# Altium schematic symbol library CUSTOM SCH - Copy.SchLib: 494 symbols (part 1 of 6)
Pins are listed as number, name and electrical type; pins without a type are passive.

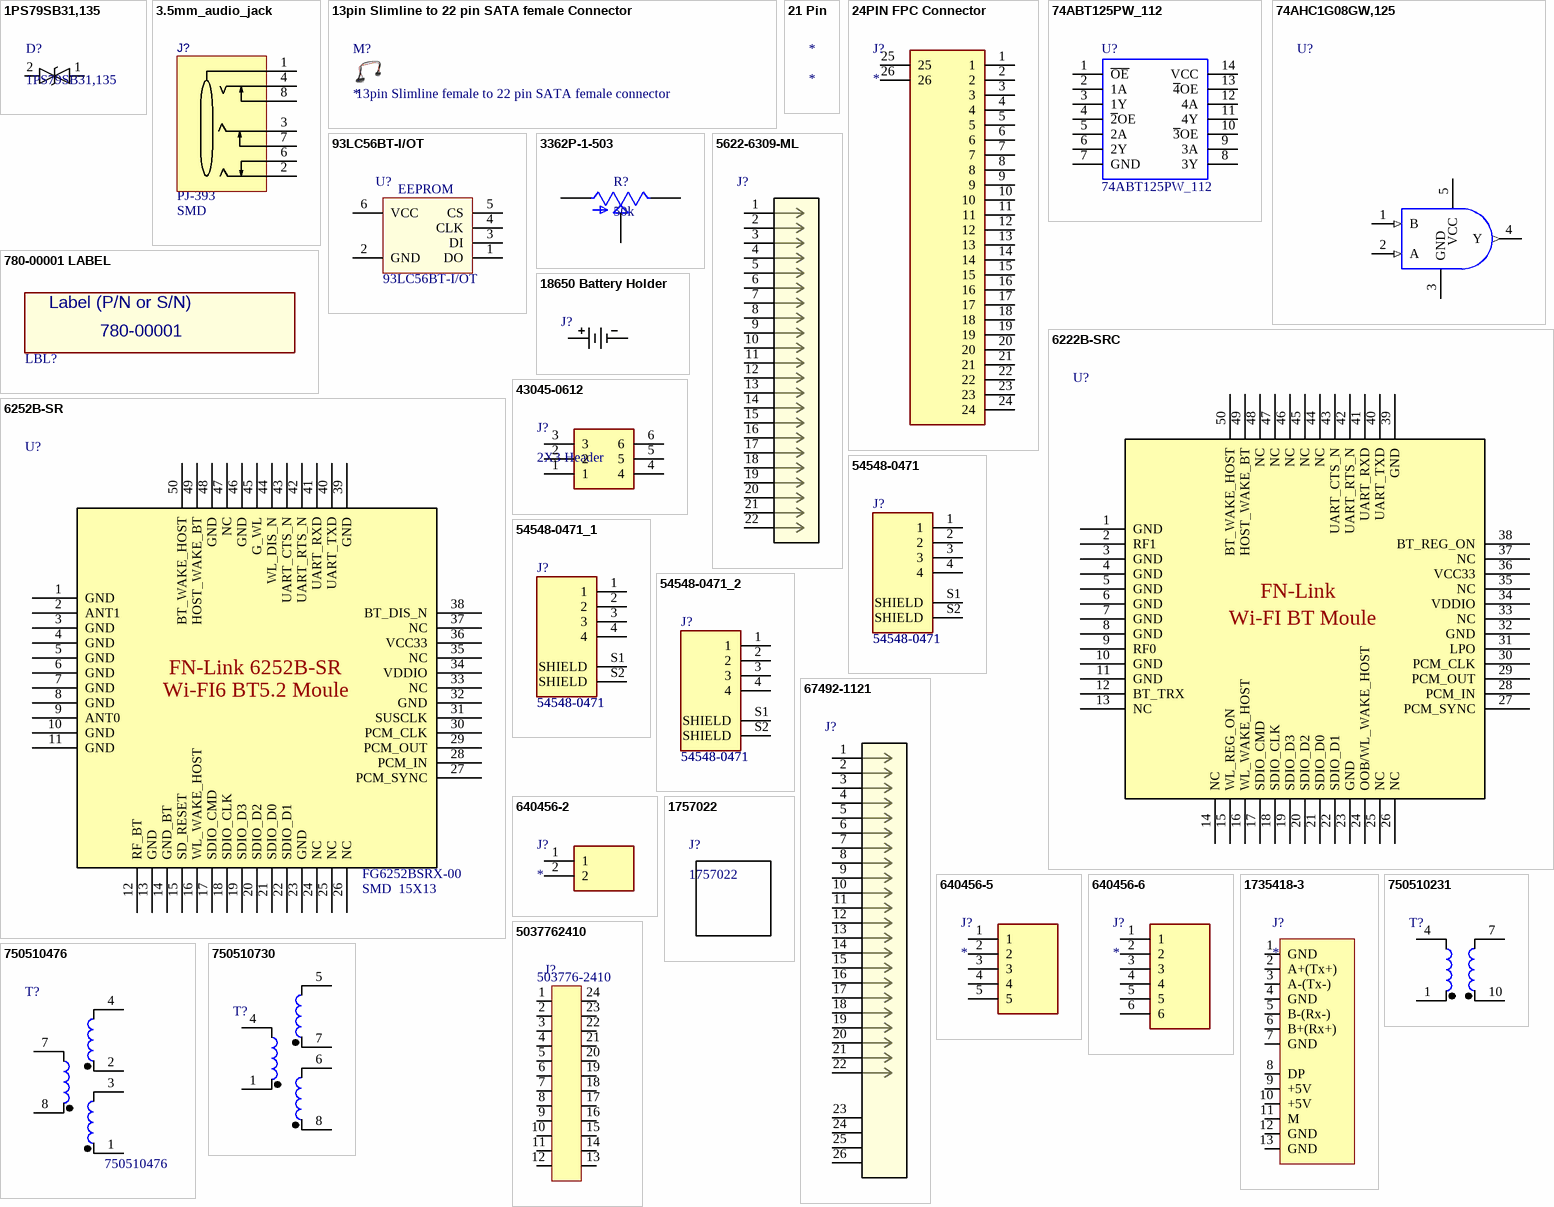
[diagram p0: symbols 1PS79SB31,135 to 5037762410]

## 1PS79SB31,135
designator D?
Diode Schottky 30V 0.2A 2-Pin SOD-523 T/R; MF: Nexperia; MP: 1PS79SB31,135; SnapEDA_Link: https://www.snapeda.com/parts/1PS79SB31%2C135/Nexperia%20USA%20Inc./view-part/?ref=snap; Package: SOD-523 NXP Semiconductors; Digi-Key_Part_Number: 1PS79SB31,135-ND; Digi-Key_Purchase_URL: https://www.digikey.in/product-detail/en/nexperia-usa-inc/1PS79SB31,135/1PS79SB31,135-ND/1229079?utm_source=snapeda&utm_medium=aggregator&utm_campaign=symbol; Value: *
footprint SOD523
pins: 1 K, 2 A

## 3.5mm_audio_jack
designator J?  Manufacturer Part Number: PJ-393  Case/Package: SMD
3.5mm headphone jack SMD Audio Connectors ROHS
footprint PJ-393
pins: 1, 2, 3, 4, 6, 7, 8

## 13pin Slimline to 22 pin SATA female Connector
designator M?  (mechanical)
13pin slimline female to 22 pin SATA female connector; Manufacturer Part Number: 13pin Slimline female to 22 pin SATA female connector

## 21 Pin
designator *

## 24PIN FPC Connector
designator J?
0.5mm Pitch 24 Way Straight SMT FPC Connector; Manufacturer Part Number: 68712414522; Case/Package: SMD/SMT
footprint 68712414522
footprint 24PIN 0.5MM FPC CONNECTOR
pins: 1, 2, 3, 4, 5, 6, 7, 8, 9, 10, 11, 12, 13, 14, 15, 16, 17, 18, 19, 20, 21, 22, 23, 24, 25, 26

## 74ABT125PW_112
designator U?
Buffers & Line Drivers QUAD BUFFER 3-S; Manufacturer_Name: Nexperia; Manufacturer_Part_Number: 74ABT125PW,112; Geometry.Height: 1.1mm; RS Part Number: *; RS Price/Stock: *; Mouser Part Number: 771-ABT125PW112; Mouser Price/Stock: https://www.mouser.com/Search/Refine.aspx?Keyword=771-ABT125PW112; Datasheet Link: https://assets.nexperia.com/documents/data-sheet/74ABT125.pdf
footprint 74ABT125PW
pins: 1 ~{OE}, 2 1A, 3 1Y, 4 ~{2}OE, 5 2A, 6 2Y, 7 GND, 8 3Y, 9 3A, 10 ~{3}OE, 11 4Y, 12 4A, 13 ~{4}OE, 14 VCC

## 74AHC1G08GW,125
designator U?  (value not drawn)
Logic IC - Gate NXP Semiconductors 74AHC1G08GW, 125 AND gate 74AHC TSSOP 5; Manufacturer: Nexperia; Supplier 1: Digi-Key; Manufacturer Part Number: 74AHC1G08GW,125; Stock 1: 41783; Pricing 1: 1=0.27, 10=0.223, 25=0.1872, 100=0.1184, 250=0.0914, 500=0.0779, 1000=0.053 (USD); Case/Package: SOT-353; Supplier Part Number 1: 1727-3148-1-ND
footprint SOT353
pins: 1 B (in), 2 A (in), 3 GND, 4 Y (out), 5 VCC (power)

## 93LC56BT-I/OT
designator U?  Memory Type: EEPROM  (hidden comment: 93LC56BT-I/OT)
MICROCHIP - 93LC56BT-I/OT. - 2K, 128 X 16, SERIAL EE, IND ROHS COMPLIANT: YES; Density: 2Kb; Max Supply Voltage: 5.5V; Min Supply Voltage: 2.5V; Access Time: 250ns; Frequency: 2MHz; Nominal Supply Current: 2mA; Supplier 1: Digi-Key; Manufacturer: Microchip; RoHS: Yes; Category: EEPROM; Stock 1: 10933; Pricing 1: 1=0.23000, 25=0.22040, 100=0.21000 (USD); Mount: Surface Mount; Case/Package: SOT-23-6; Number of Pins: 6; Contact Plating: Tin,Matte; Min Operating Temperature: -40°C; Max Operating Temperature: 85°C; Packaging: Tape and Reel; Package Quantity: 3000; Interface: Serial; Memory Size: 2Kb; Max Frequency: 2MHz; Length: 3.1mm; Height: 1.3mm; Width: 1.8mm; Radiation Hardening: No; REACH SVHC: No SVHC; Lead Free: Lead Free; ComponentLink1URL: https://datasheet.ciiva.com/48496/jp013939-48496476.pdf?src-supplier=Avnet; ComponentLink1Description: https://datasheet.ciiva.com/48496/jp013939-48496476.pdf?src-supplier=Avnet; ComponentLink2URL: https://datasheet.ciiva.com/16216/filehandler-aspxddocname-en013939-16216574.pdf?src-supplier=Future+Electronics; ComponentLink2Description: https://datasheet.ciiva.com/16216/filehandler-aspxddocname-en013939-16216574.pdf?src-supplier=Future+Electronics; ComponentLink3URL: https://datasheet.ciiva.com/3185/jp013939-3185519.pdf?src-supplier=Avnet; ComponentLink3Description: https://datasheet.ciiva.com/3185/jp013939-3185519.pdf?src-supplier=Avnet; ComponentLink4URL: https://datasheet.ciiva.com/16622/jp013939-16622127.pdf?src-supplier=Avnet+Europe; ComponentLink4Description: https://datasheet.ciiva.com/16622/jp013939-16622127.pdf?src-supplier=Avnet+Europe; Supplier Part Number 1: 93LC56BT-I/OTCT-ND; Manufacturer Part Number: 93LC56BT-I/OT
footprint SOT-23-6
pins: 1 DO, 2 GND, 3 DI, 4 CLK, 5 CS, 6 VCC

## 780-00001 LABEL
designator LBL?, comment Label (P/N or S/N)  PartNumber: 780-00001
Label, blank, 1.25" x .25", High Temp Rated; Device: 780-00001

## 3362P-1-503
designator R?, comment 50k
50 kOhms 0.5W, 1/2W PC Pins Through Hole Trimmer Potentiometer Cermet 1 Turn Top Finger Adjustment; Manufacturer Part Number: 3362P-1-503; Case/Package: 3116 Bourns; Value: 50k
footprint TRIM_3362P-1-503
footprint TRIM_3362P-1-503
pins: 1 CCW, 2 WIPER, 3 CW

## 5622-6309-ML
designator J?
SATA CONNECTOR, PLUG, 22 POSITION, Connector Type:SATA; Gender:Male; Manufacturer 1: 3M; Manufacturer Part Number 1: 5622-6309-ML; Gender: Male; Max Current Rating: 1.5A; Number of Positions: 22; Insulation Resistance: 1GR; Number of Ports: 1; Connector Type: Plug,SATA; Pitch: 1.27mm; ComponentLink1URL: https://datasheet.ciiva.com/16651/0674921121-pcb-receptacles-16651858.pdf?src-supplier=Avnet+Europe; ComponentLink1Description: https://datasheet.ciiva.com/16651/0674921121-pcb-receptacles-16651858.pdf?src-supplier=Avnet+Europe; Supplier 1: Digi-Key; RoHS: Yes; Category: Connectors; Stock 1: 5747; Pricing 1: 1=2.88000, 10=2.76500, 25=2.53440, 50=2.41920, 100=2.30400, 250=2.01600, 500=1.95840, 1000=1.67040, 2500=1.55520 (USD); Mount: Straddle Mount,Edge; Housing Material: Thermoplastic; Contact Plating: Gold; Contact Material: Copper Alloy; Color: Black; Number of Terminals: 22; Housing Color: Black; Min Operating Temperature: -40°C; Max Operating Temperature: 85°C; Packaging: Tray; Termination: Solder; Orientation: Straight; Package Quantity: 1944; Current Rating: 1.5A; Number of Rows: 1; Number of Contacts: 22; Length: 45.77mm; Depth: 12mm; Flammability Rating: UL94 V-0; REACH SVHC: No SVHC; Lead Free: Lead Free; ComponentLink2URL: https://datasheet.ciiva.com/25617/0900766b80934e8c-25617710.pdf?src-supplier=RSComponents; ComponentLink2Description: https://datasheet.ciiva.com/25617/0900766b80934e8c-25617710.pdf?src-supplier=RSComponents; ComponentLink3URL: https://datasheet.ciiva.com/689/cd2109-689552.pdf?src-supplier=Digi-Key; ComponentLink3Description: https://datasheet.ciiva.com/689/cd2109-689552.pdf?src-supplier=Digi-Key; ComponentLink4URL: https://datasheet.ciiva.com/3955/mediawebserver3-3955586.pdf?src-supplier=Arrow; ComponentLink4Description: https://datasheet.ciiva.com/3955/mediawebserver3-3955586.pdf?src-supplier=Arrow; ComponentLink5URL: https://datasheet.ciiva.com/4570/cd2109-4570023.pdf?src-supplier=Mouser; ComponentLink5Description: https://datasheet.ciiva.com/4570/cd2109-4570023.pdf?src-supplier=Mouser; ComponentLink6URL: https://datasheet.ciiva.com/8015/cd2109-8015174.pdf?src-supplier=Element14; ComponentLink6Description: https://datasheet.ciiva.com/8015/cd2109-8015174.pdf?src-supplier=Element14; Supplier Part Number 1: 3M5555-ND
footprint 5622-6309-ML
pins: 1, 2, 3, 4, 5, 6, 7, 8, 9, 10, 11, 12, 13, 14, 15, 16, 17, 18, 19, 20, 21, 22

## 6222B-SRC
designator U?
5GHz SDIO WiFi BT Module With RTL8822CS Chipset Support 802.11ac; Manufacturer Part Number: FG6222BSRC-00; Case/Package: SMD  15X13
footprint FG6222BSRC-00
pins: 1 GND, 2 RF1, 3 GND, 4 GND, 5 GND, 6 GND, 7 GND, 8 GND, 9 RF0, 10 GND, 11 GND, 12 BT_TRX, 13 NC, 14 NC, 15 WL_REG_ON, 16 WL_WAKE_HOST, 17 SDIO_CMD, 18 SDIO_CLK, 19 SDIO_D3, 20 SDIO_D2, 21 SDIO_D0, 22 SDIO_D1, 23 GND, 24 OOB/WL_WAKE_HOST, 25 NC, 26 NC, 27 PCM_SYNC, 28 PCM_IN, 29 PCM_OUT, 30 PCM_CLK, 31 LPO, 32 GND, 33 NC, 34 VDDIO, 35 NC, 36 VCC33, 37 NC, 38 BT_REG_ON, 39 GND, 40 UART_TXD, 41 UART_RXD, 42 UART_RTS_N, 43 UART_CTS_N, 44 NC, 45 NC, 46 NC, 47 NC, 48 NC, 49 HOST_WAKE_BT, 50 BT_WAKE_HOST
text: FN-Link; Wi-FI BT Moule

## 6252B-SR
designator U?  Manufacturer Part Number: FG6252BSRX-00  Case/Package: SMD  15X13
WiFi6 SDIO WiFi BT5.2 Module With
footprint FG6252BSRX-00
pins: 1 GND, 2 ANT1, 3 GND, 4 GND, 5 GND, 6 GND, 7 GND, 8 GND, 9 ANT0, 10 GND, 11 GND, 12 RF_BT, 13 GND, 14 GND_BT, 15 SD_RESET, 16 WL_WAKE_HOST, 17 SDIO_CMD, 18 SDIO_CLK, 19 SDIO_D3, 20 SDIO_D2, 21 SDIO_D0, 22 SDIO_D1, 23 GND, 24 NC, 25 NC, 26 NC, 27 PCM_SYNC, 28 PCM_IN, 29 PCM_OUT, 30 PCM_CLK, 31 SUSCLK, 32 GND, 33 NC, 34 VDDIO, 35 NC, 36 VCC33, 37 NC, 38 BT_DIS_N, 39 GND, 40 UART_TXD, 41 UART_RXD, 42 UART_RTS_N, 43 UART_CTS_N, 44 WL_DIS_N, 45 G_WL, 46 GND, 47 NC, 48 GND, 49 HOST_WAKE_BT, 50 BT_WAKE_HOST
text: FN-Link 6252B-SR; Wi-FI6 BT5.2 Moule

## 18650 Battery Holder
designator J?, comment 1042P  (value not drawn)
Manufacturer_Part_Number: 1042P; Case/Package: SMT
footprint 1042P_KEY
footprint 18650 Battery holder (1042P)
pins: 1, 2

## 43045-0612
designator J?, comment 2X3 Header
Micro-Fit 3.0 Vertical Header; Manufacturer Part Number: 43045-0612; Case/Package: TH
footprint 430450612
pins: 1, 2, 3, 4, 5, 6

## 54548-0471
designator J?
FFC & FPC Connectors 0.5 FPC 4 pin; Manufacturer Part Number: 54548-0471
footprint MOLEX_54548-0471
pins: 1, 2, 3, 4, S1 SHIELD, S2 SHIELD

## 54548-0471_1
designator J?, comment 54548-0471
FFC & FPC Connectors 0.5 FPC 4 pin; Manufacturer Part Number: 54548-0471
footprint MOLEX_54548-0471
pins: 1, 2, 3, 4, S1 SHIELD, S2 SHIELD

## 54548-0471_2
designator J?, comment 54548-0471
FFC & FPC Connectors 0.5 FPC 4 pin; Manufacturer Part Number: 54548-0471
footprint MOLEX_54548-0471
pins: 1, 2, 3, 4, S1 SHIELD, S2 SHIELD

## 67492-1121
designator J?
Conn SATA RCP 15Power/7Signal POS 1.27mm Solder RA SMD 22 Terminal 1 Port Tray; Manufacturer 1: Molex; Manufacturer Part Number 1: 67492-1121; Connector Type: SMD/SMT; Number of Positions: 22; Max Voltage Rating (DC): 15V; Current Rating: 1.5A; Gender: Female; Glow Wire Compliant: Non-compliant; Supplier 1: Mouser; RoHS: Yes; Category: Headers and Wire Housings; Stock 1: 83; Pricing 1: 1=3.18000, 10=3.05000, 25=2.67000, 100=2.54000, 250=2.22000, 500=2.16000, 1000=1.84000, 2500=1.71000, 5000=1.65000 (USD); Mount: Surface Mount; Case/Package: SMD/SMT; Housing Material: Thermoplastic; Contact Plating: Gold; Contact Material: Copper Alloy; Color: Black; Min Operating Temperature: -35°C; Max Operating Temperature: 85°C; Termination: Solder; Orientation: Right Angle; Package Quantity: 840; Packaging: Tray; Number of Rows: 1; Number of Circuits: 22; Voltage Rating (DC): 15V; Pitch: 1.27mm; Radiation Hardening: No; ComponentLink1URL: https://datasheet.ciiva.com/16651/0674921121-pcb-receptacles-16651858.pdf?src-supplier=Avnet+Europe; ComponentLink1Description: https://datasheet.ciiva.com/16651/0674921121-pcb-receptacles-16651858.pdf?src-supplier=Avnet+Europe; Supplier Part Number 1: 538-67492-1121
footprint 67492-1121
pins: 1, 2, 3, 4, 5, 6, 7, 8, 9, 10, 11, 12, 13, 14, 15, 16, 17, 18, 19, 20, 21, 22, 23, 24, 25, 26

## 640456-2
designator J?
2 way MTA straight friction lock header TE Connectivity MTA-100 Series; Manufacturer Part Number: 640456-2; Datasheet Link: http://www.te.com/commerce/DocumentDelivery/DDEController?Action=showdoc&DocId=Customer+Drawing%7F640456%7FW3%7Fpdf%7FEnglish%7FENG_CD_640456_W3.pdf%7F640456-2; Height: 10.414mm; Manufacturer_Name: TE Connectivity
footprint SHDR2W66P0X254_1X2_508X572X1041P
footprint SHDR2W66P0X254_1X2_508X572X1041P
pins: 1, 2

## 640456-5
designator J?
5 way MTA straight friction lock header; Manufacturer_Part_Number: 640456-5; Package: TH; Value: *
footprint SHDR5W66P0X254_1X5_1270X572X1024P
footprint SHDR5W66P0X254_1X5_1270X572X1024P
pins: 1, 2, 3, 4, 5

## 640456-6
designator J?
Headers & Wire Housings FRICTION LCK HDR 6P Straight Post tin; Manufacturer_Name: TE Connectivity; Manufacturer Part Number: 640456-6; Datasheet Link: https://www.mouser.com/ProductDetail/TE-Connectivity/640456-6?qs=%2F35zJ5USjomb%252bGgX%252bBnrrQ%3D%3D&gclid=CjwKCAjwkoz7BRBPEiwAeKw3q0mcLif-2aBBbbX-TwuIeMidB_ARULgbAE-SJPQzeNro84r-4lxoHhoCr1IQAvD_BwE; Height: 10.033mm; Package: Through Hole
footprint SHDR6W66P0X254_1X6_1524X572X1003P
pins: 1, 2, 3, 4, 5, 6

## 1735418-3
designator J?
CONN SATA PLUG 13POS SLD R/A SMD; Manufacturer Part Number: 1735418-3; Case/Package: SMD
footprint 1735418-3
pins: 1 GND, 2 A+(Tx+), 3 A-(Tx-), 4 GND, 5 B-(Rx-), 6 B+(Rx+), 7 GND, 8 DP, 9 +5V, 10 +5V, 11 M, 12 GND, 13 GND

## 1757022
designator J?  (mechanical)
TERM BLOCK PLUG 3POS STR 5.08MM; Manufacturer Part Number: 1757022

## 750510231
designator T?  (value not drawn)
Manufacturer: Wurth Electronics; Manufacturer Part Number: 750510231; Supplier 1: Mouser; Stock 1: 346; Pricing 1: 1=3.43, 10=3.21, 50=2.89, 100=2.66, 250=2.39, 500=2.15, 1000=2.15, 10000=2.15 (USD); Packaging: Tray; Package Quantity: 650; ComponentLink1URL: http://www.mouser.com/ds/2/445/750510231-465484.pdf?src-supplier=Mouser; ComponentLink1Description: http://www.mouser.com/ds/2/445/750510231-465484.pdf?src-supplier=Mouser; Supplier Part Number 1: 710-750510231
footprint L14_W14_H13.46
pins: 1 5, 4, 7 5, 10 6

## 750510476
designator T?  Manufacturer Part Number: 750510476  (hidden comment: *)
Manufacturer: Wurth Electronics; Shielding: Unshielded; Inductance: 870uH; DC Resistance (DCR): 85mR; Supplier 1: Digi-Key; Stock 1: 881; Pricing 1: 1=5.86, 10=5.782, 50=5.421, 100=4.879, 500=4.337 (USD); Mount: Through Hole; Min Operating Temperature: -40°C; Max Operating Temperature: 125°C; Packaging: Tray; Termination: Pin; Length: 19.8mm; Height: 10.16mm; Width: 19.69mm; Height - Seated (Max): 10.16mm; ComponentLink1URL: http://www.mouser.com/ds/2/445/750510476-265876.pdf?src-supplier=Mouser; ComponentLink1Description: http://www.mouser.com/ds/2/445/750510476-265876.pdf?src-supplier=Mouser; ComponentLink2URL: http://katalog.we-online.de/pbs/datasheet/750510476.pdf?src-supplier=Digi-Key; ComponentLink2Description: http://katalog.we-online.de/pbs/datasheet/750510476.pdf?src-supplier=Digi-Key; Supplier Part Number 1: 1297-1074-ND
footprint L13.72_W19.8_H10.16
pins: 1, 2, 3, 4, 7, 8

## 750510730
designator T?  (value not drawn)
Manufacturer: Wurth Electronics Midcom; Manufacturer Part Number: 750510730; Inductance: 1uH; Turns Ratio: 1:1; Supplier 1: Digi-Key; Stock 1: 0; Pricing 1: 140=3.696, 280=3.36 (USD); Mount: Surface Mount; Packaging: Tape and Reel; ComponentLink1URL: https://katalog.we-online.de/ctm/datasheet/750510730.pdf?src-supplier=Digi-Key; ComponentLink1Description: https://katalog.we-online.de/ctm/datasheet/750510730.pdf?src-supplier=Digi-Key; Supplier Part Number 1: 1297-1203-2-ND
footprint L13.97_W15.4_H13.2
pins: 1 5, 4, 5, 6, 7, 8 6

## 5037762410
designator J?  Manufacturer Part Number: 503776-2410  (hidden comment: 5037762410)
CONN PLUG 24CKT DUAL SMD; Manufacturer 1: Molex; Gender: Male; Number of Circuits: 24; Voltage Rating (AC): 50V; Current Rating: 300mA; Mated Stacking Heights: 0.8mm; Pitch: 0.4mm; Glow Wire Compliant: Non-compliant; Supplier 1: Digi-Key; RoHS: Yes; Category: Headers and Wire Housings; Stock 1: 1034; Pricing 1: 1=1.17000, 10=0.97100, 100=0.80920, 1000=0.64736 (USD); Mount: Surface Mount; Material: Copper Alloy; Housing Material: Polymer; Contact Material: Copper Alloy; Contact Plating: Gold; Min Operating Temperature: -40°C; Max Operating Temperature: 85°C; Orientation: Vertical; Number of Rows: 2; Connector Type: Plug; Number of Positions: 24; Packaging: Tape and Reel; Termination: SMD/SMT; Package Quantity: 3000; Halogen Free: Low Halogen; ELV: Compliant; REACH SVHC: No SVHC; ComponentLink1URL: https://datasheet.ciiva.com/13869/5037762410-pcb-headers-263019-13869703.pdf?src-supplier=Mouser; ComponentLink1Description: https://datasheet.ciiva.com/13869/5037762410-pcb-headers-263019-13869703.pdf?src-supplier=Mouser; ComponentLink2URL: https://datasheet.ciiva.com/394/5037762410-sd-394935.pdf?src-supplier=Digi-Key; ComponentLink2Description: https://datasheet.ciiva.com/394/5037762410-sd-394935.pdf?src-supplier=Digi-Key; ComponentLink3URL: https://datasheet.ciiva.com/394/5037762410-sd-394936.pdf?src-supplier=Digi-Key; ComponentLink3Description: https://datasheet.ciiva.com/394/5037762410-sd-394936.pdf?src-supplier=Digi-Key; ComponentLink4URL: https://datasheet.ciiva.com/394/5037762410-sd-394937.pdf?src-supplier=Digi-Key; ComponentLink4Description: https://datasheet.ciiva.com/394/5037762410-sd-394937.pdf?src-supplier=Digi-Key; Supplier Part Number 1: WM6257CT-ND
footprint 5037762410
pins: 1, 2, 3, 4, 5, 6, 7, 8, 9, 10, 11, 12, 13, 14, 15, 16, 17, 18, 19, 20, 21, 22, 23, 24

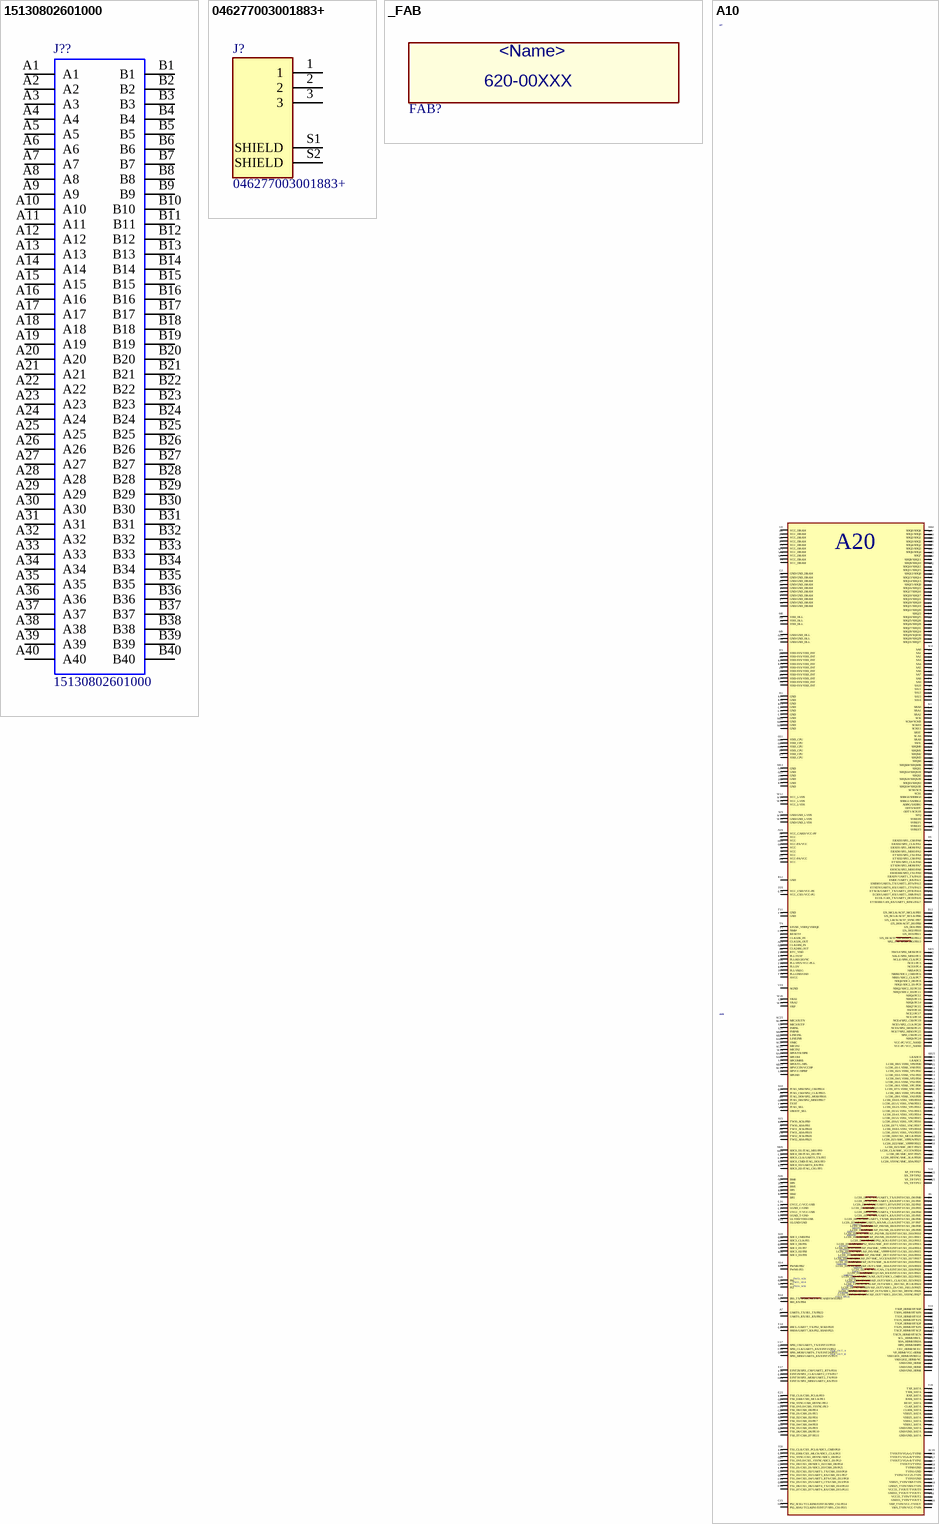
[diagram p1: symbols 15130802601000 to A10]

## 15130802601000
designator J??
Connectors, Male connector, Reflow soldering termination (SMT), Contacts: 80, Straight; Manufacturer_Name: HARTING; Mouser Part Number: 617-15130802601000; Mouser Price/Stock: https://www.mouser.co.uk/ProductDetail/HARTING/15130802601000?qs=T3oQrply3y8YCfsDYHbKbQ%3D%3D; Manufacturer_Part_Number: 15130802601000; Datasheet Link: https://b2b.harting.com/files/download/PRD/PDF_TS/1513XXXX601XXX_100222441DRW003C.pdf
footprint 15130802601000
footprint 15130802601000 harting connector
footprint 15130802601000 harting connector
pins: A1, A2, A3, A4, A5, A6, A7, A8, A9, A10, A11, A12, A13, A14, A15, A16, A17, A18, A19, A20, A21, A22, A23, A24, A25, A26, A27, A28, A29, A30, A31, A32, A33, A34, A35, A36, A37, A38, A39, A40, B1, B2, B3, B4, B5, B6, B7, B8, B9, B10, B11, B12, B13, B14, B15, B16, B17, B18, B19, B20, B21, B22, B23, B24, B25, B26, B27, B28, B29, B30, B31, B32, B33, B34, B35, B36, B37, B38, B39, B40